# Altium footprint library 通讯接口.PcbLib: 19 footprints (part 1 of 2)
Each footprint in its own frame and in the unit in brackets; x right, y up, seen from the top. Pads: shape width x height; smd on the part's side, far side on the other; paste and mask are expansions set on the pad; w line width, h text height; cw(c..) or ccw(c..) is an arc to the next point about the centre after c.
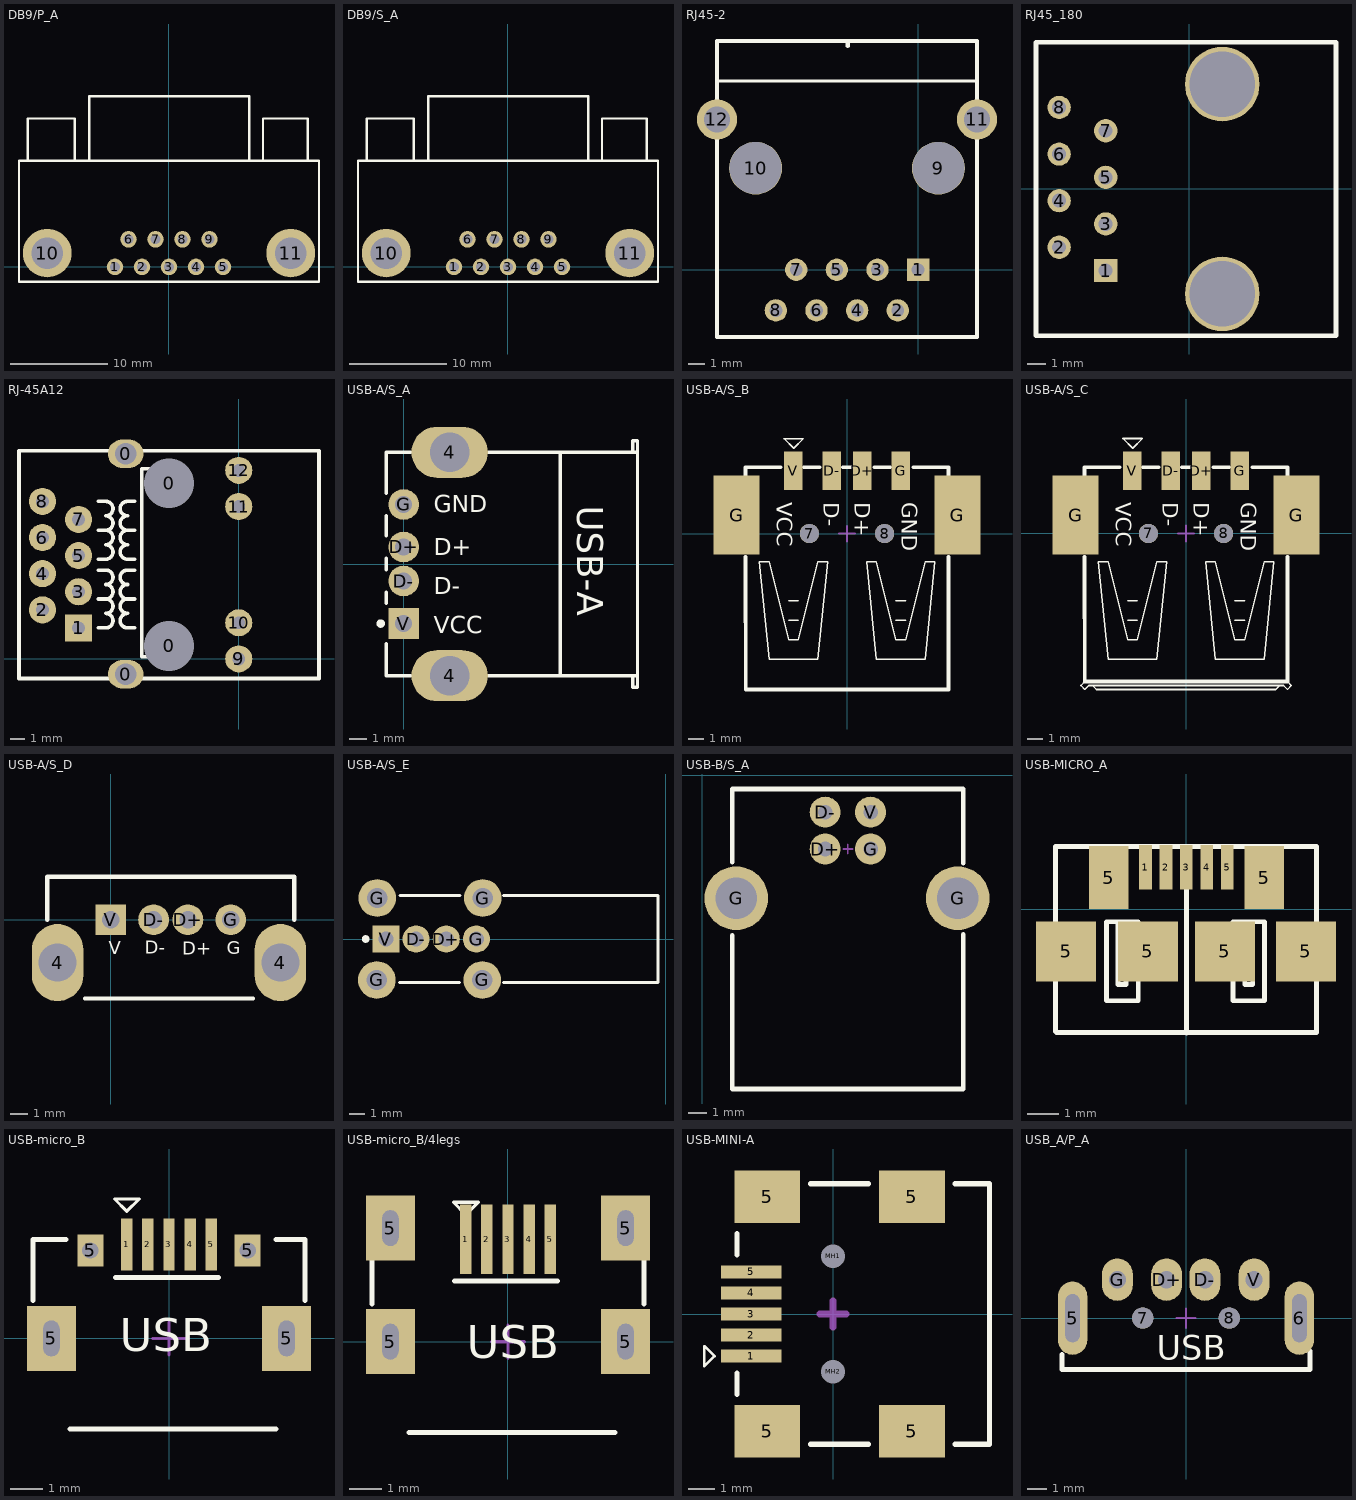
[diagram p0: the footprints below, top view; thin cyan lines are the x and y axes]

## DB9/P_A [mm] "9针公头串口,31*18.5*12.5mm"
pads (11):
  round 1.7 hole 1: 1(-5.546,0) 2(-2.773,0) 3(0,0) 4(2.773,0) 5(5.546,0) 6(-4.155,2.84) 7(-1.385,2.84) 8(1.385,2.84) 9(4.155,2.84)
  round 5 hole 3.25: 10(-12.5,1.42) 11(12.5,1.42)
Top Overlay:
  lines w0.254: -14.478,10.922 -14.478,15.24 -9.652,15.24 -9.652,10.922 ; -8.175,10.922 -8.175,17.526 8.225,17.526 8.225,10.922 ; 9.652,10.922 9.652,15.24 14.224,15.24 14.224,10.922 ; -15.4,-1.524 -15.4,10.922 15.4,10.922 15.4,-1.524 -15.4,-1.524
3D body "DB9 ĸ_A.STEP": height 12.65, standoff -3.16, extent -15.45,-1.253 15.45,17.247

## DB9/S_A [mm] "9针母头串口,31*18.5*12.5mm"
pads (11):
  round 1.7 hole 1: 1(-5.546,0) 2(-2.773,0) 3(0,0) 4(2.773,0) 5(5.546,0) 6(-4.155,2.84) 7(-1.385,2.84) 8(1.385,2.84) 9(4.155,2.84)
  round 5 hole 3.25: 10(-12.5,1.42) 11(12.5,1.42)
Top Overlay:
  lines w0.254: -14.478,10.922 -14.478,15.24 -9.652,15.24 -9.652,10.922 ; -8.175,10.922 -8.175,17.526 8.225,17.526 8.225,10.922 ; 9.652,10.922 9.652,15.24 14.224,15.24 14.224,10.922 ; -15.4,-1.524 15.4,-1.524 15.4,10.922 -15.4,10.922 -15.4,-1.524
3D body "DB9 公_A.STEP": height 12.65, standoff -3.16, extent -15.45,-1.253 15.45,17.247

## RJ45-2 [mil] "网线接口"
pads (12):
  rect 55x55 hole 31.5: 1(0,0)
  round 55 hole 31.5: 2(-50,-100) 3(-100,0) 4(-150,-100) 5(-200,0) 6(-250,-100) 7(-300,0) 8(-350,-100)
  round 130 hole 127.95 unplated: 9(50,250) 10(-400,250)
  round 98.42 hole 62.99: 11(145,370) 12(-495,370)
Top Overlay:
  lines w8: -488.19,464.57 141.73,464.57
  lines w10: -495,-165.35 144.65,-165.35 145,-165 145,370 145,562.99 -495,562.99 -495,370 -495,-165 ; -173.23,551.18 -173.23,559.06
3D body "Mod-Jack-K122449007-Stig-W.STEP": height 127.85, standoff -555.12, extent -490,-172.17 139.92,556.17

## RJ45_180 [mil] "网线接口"
height 53.15
pads (10):
  rect 50x50 hole 30: 1(-179.13,-175)
  round 50 hole 30: 2(-279.13,-125) 3(-179.13,-75) 4(-279.13,-25) 5(-179.13,25) 6(-279.13,75) 7(-179.13,125) 8(-279.13,175)
  round 160 hole 140: ""(70.87,-225) ""(70.87,225)
Top Overlay:
  lines w10: -328.74,-314.96 -328.74,314.96 314.96,314.96 314.96,-314.96 -328.74,-314.96
3D body "RJ-45, 8P8C, MOD JACK, TOP ENTRY, CAT 5E, RIA AJT26A8813.STEP": height 641.73, standoff -129.92, extent -313.88,-296.61 308.16,313.62

## RJ-45A12 [mil] "网线接口"
pads (16):
  oval 98.43x78.74 hole 59.06: 0(-312.99,-42.13) 0(-312.99,567.32)
  round 130 hole 137.8: 0(-192.91,35.83) 0(-192.91,485.83)
  rect 75x75 hole 35.43: 1(-442.91,85.83)
  round 75 hole 35.43: 2(-542.91,135.83) 3(-442.91,185.83) 4(-542.91,235.83) 5(-442.91,285.83) 6(-542.91,335.83) 7(-442.91,385.83) 8(-542.91,435.83) 9(0,0) 10(0,100) 11(0,421.65) 12(0,521.65)
Top Overlay:
  lines w10: -387.91,85.83 -367.91,85.83 ccw(c-367.91,105.83) -367.91,125.83 ccw(c-367.91,145.83) -367.91,165.83 ; -387.91,165.83 -367.91,165.83 ; -387.91,245.83 -367.91,245.83 cw(c-367.91,225.83) -367.91,205.83 cw(c-367.91,185.83) -367.91,165.83 ; -387.91,275.83 -367.91,275.83 ccw(c-367.91,295.83) -367.91,315.83 ccw(c-367.91,335.83) -367.91,355.83 ; -387.91,355.83 -367.91,355.83 ; -387.91,435.83 -367.91,435.83 cw(c-367.91,415.83) -367.91,395.83 cw(c-367.91,375.83) -367.91,355.83 ; -287.91,85.83 -307.91,85.83 cw(c-307.91,105.83) -307.91,125.83 cw(c-307.91,145.83) -307.91,165.83 ; -287.91,165.83 -307.91,165.83 ; -287.91,245.83 -307.91,245.83 ccw(c-307.91,225.83) -307.91,205.83 ccw(c-307.91,185.83) -307.91,165.83 ; -287.91,275.83 -307.91,275.83 cw(c-307.91,295.83) -307.91,315.83 cw(c-307.91,335.83) -307.91,355.83 ; -287.91,355.83 -307.91,355.83 ; -287.91,435.83 -307.91,435.83 ccw(c-307.91,415.83) -307.91,395.83 ccw(c-307.91,375.83) -307.91,355.83 ; -247.91,5.83 -267.91,5.83 -267.91,525.83 -247.91,525.83 ; -607.91,-54.17 222,-54.17 222,575.83 -607.91,575.83 -607.91,-54.17
Multi-Layer:
  text "J10" at -517.7,505.32 h25
3D body "HanRun-HR911105A.STEP": height 59.06, standoff -590.55, extent -605.26,-53 237.26,572.19

## USB-A/S_A [mm] "A型直插母头，"
height 7.01
pads (6):
  oval 4.5x3 hole 2.3: 4(2.71,-6.57) 4(2.71,6.57)
  round 1.8 hole 1: D+(0,1) D-(0,-1) G(0,3.5)
  rect 1.8x1.8 hole 1: V(0,-3.5)
Top Overlay:
  circle w0.25: c-1.35,-3.5 r0.125
  lines w0.2: -1.01,-4.7 -1.01,-6.565 0.41,-6.565 ; -1.01,-2.3 -1.01,-1.66 ; -1.01,-0.34 -1.01,0.34 ; -1.01,1.66 -1.01,2.84 ; -1.01,4.16 -1.01,6.565 0.41,6.565 ; 5.01,-6.565 13.752,-6.565 ; 5.01,6.565 13.752,6.565 ; 13.462,-6.565 13.462,-7.25 13.752,-7.25 13.752,7.25 13.462,7.25 13.462,6.565
  lines w0.203: 9.21,-6.565 9.21,6.565
  text "GND" at 1.778,3.048 h1.02
  text "D+" at 1.778,0.508 h1.02
  text "D-" at 1.778,-1.778 h1.02
  text "VCC" at 1.778,-4.064 h1.02
  text "USB-A" at 10.21,3.43 h1.52
3D body "USB A型 母-1.STEP": height 6.8, standoff -4.31, extent -0.605,-7.342 13.7,7.342

## USB-A/S_B [mm] "A型贴片母头，"
pads (8):
  round 1.25 hole 1.25 unplated: 7(-2.45,0) 8(2.45,0)
  rect 1.2x2.5 smd: D+(1,4.1) D-(-1,4.1) G(3.5,4.1) V(-3.5,4.1)
  rect 3x5.15 smd: G(-7.2,1.2) G(7.2,1.2)
Top Overlay:
  lines w0.1: -3.803,-5.649 -3.168,-5.649 ; -3.803,-4.379 -3.168,-4.379 ; 3.182,-5.649 3.817,-5.649 ; 3.182,-4.379 3.817,-4.379 ; -5.708,-1.839 -5.073,-1.839 -3.803,-6.919 -3.168,-6.919 -1.898,-1.839 -1.263,-1.839 -1.898,-8.189 -5.073,-8.189 -5.708,-1.839 ; -4.113,6.19 -2.843,6.19 -3.478,5.555 -4.113,6.19 ; 1.277,-1.839 1.912,-1.839 3.182,-6.919 3.817,-6.919 5.087,-1.839 5.722,-1.839 5.087,-8.189 1.912,-8.189 1.277,-1.839
  lines w0.254: -6.604,-1.524 -6.597,-10.16 6.611,-10.16 6.604,-1.524 ; -6.604,3.81 -6.604,4.318 -4.318,4.318 ; -2.794,4.318 -1.778,4.318 ; -0.254,4.318 0.254,4.318 ; 1.778,4.318 2.794,4.318 ; 4.318,4.318 6.611,4.318 6.604,3.81
  text "VCC" at -4.572,2.032 h1.02
  text "D-" at -1.524,2.032 h1.02
  text "D+" at 0.508,2.032 h1.02
  text "GND" at 3.556,2.032 h1.02
Mechanical 15:
  lines w0.127: -0.508,0 0.508,0 ; 0,-0.508 0,0.508
3D body "USB A型 贴片-母-1.STEP": height 6.9, standoff -0.55, extent -7.75,-9.9 7.75,4.8

## USB-A/S_C [mm] "A型贴片母头，"
pads (8):
  round 1.25 hole 1.25 unplated: 7(-2.45,0) 8(2.45,0)
  rect 1.2x2.5 smd: D+(1,4.1) D-(-1,4.1) G(3.5,4.1) V(-3.5,4.1)
  rect 3x5.15 smd: G(-7.2,1.2) G(7.2,1.2)
Top Overlay:
  lines w0.1: -6.597,-9.652 -6.851,-9.906 -6.597,-10.16 -6.343,-9.906 -6.089,-9.906 ; -3.803,-5.649 -3.168,-5.649 ; -3.803,-4.379 -3.168,-4.379 ; 3.182,-5.649 3.817,-5.649 ; 3.182,-4.379 3.817,-4.379 ; 6.611,-9.652 6.865,-9.906 6.611,-10.16 6.357,-9.906 6.103,-9.906 ; -6.089,-9.906 -5.835,-10.166 5.849,-10.166 6.103,-9.906 ; -6.089,-9.906 6.103,-9.906 ; -5.708,-1.839 -5.073,-8.189 -1.898,-8.189 -1.263,-1.839 -1.898,-1.839 -3.168,-6.919 -3.803,-6.919 -5.073,-1.839 -5.708,-1.839 ; -4.113,6.19 -3.478,5.555 -2.843,6.19 -4.113,6.19 ; 1.277,-1.839 1.912,-8.189 5.087,-8.189 5.722,-1.839 5.087,-1.839 3.817,-6.919 3.182,-6.919 1.912,-1.839 1.277,-1.839
  lines w0.254: -6.604,-1.524 -6.597,-9.652 ; -6.604,3.81 -6.604,4.318 -4.318,4.318 ; -6.597,-9.652 6.611,-9.652 ; -2.794,4.318 -1.778,4.318 ; -0.254,4.318 0.254,4.318 ; 1.778,4.318 2.794,4.318 ; 4.318,4.318 6.611,4.318 6.604,3.81 ; 6.604,-1.524 6.611,-9.652
  text "GND" at 3.556,2.032 h1.02
  text "D+" at 0.508,2.032 h1.02
  text "D-" at -1.524,2.032 h1.02
  text "VCC" at -4.572,2.032 h1.02
Mechanical 15:
  lines w0.127: -0.508,0 0.508,0 ; 0,-0.508 0,0.508
3D body "USB A型 贴片-母-2.STEP": height 7.4, standoff -0.55, extent -7.75,-9.9 7.75,4.8

## USB-A/S_D [mm] "A型直插母头，"
pads (6):
  oval 3x4.5 hole 2.2: 4(-3.1,-2.5) 4(9.9,-2.5)
  round 1.8 hole 1: D+(4.5,0) D-(2.5,0) G(7,0)
  rect 1.8x1.8 hole 1: V(0,0)
Top Overlay:
  lines w0.254: -3.7,0 -3.7,2.5 10.7,2.5 10.7,0 ; -1.5,-4.6 8.3,-4.6
  text "D-" at 1.996,-1.981 h0.76
  text "D+" at 4.181,-2.032 h0.76
  text "G" at 6.771,-2.007 h0.76
  text "V" at -0.112,-2.007 h0.76
Mechanical 1:
  lines w0.254: -0.2,-0.2 cw(c0,-0.2) 0,0
3D body "USB-H.stp": height 14, standoff -4, extent -3.705,-4.599 10.695,2.501

## USB-A/S_E [mm] "A型直插母头，"
pads (8):
  round 1.8 hole 1: D+(-14.56,0) D-(-16.56,0) G(-12.56,0)
  round 2.5 hole 1.35: G(-19.167,-2.718) G(-19.141,2.718) G(-12.167,-2.718) G(-12.141,2.718)
  rect 1.8x1.8 hole 1: V(-18.56,0)
Top Overlay:
  circle w0.25: c-19.91,0 r0.125
  lines w0.2: -17.65,-2.878 -13.684,-2.878 ; -17.624,2.878 -13.658,2.878 ; -10.773,-2.88 -0.508,-2.88 -0.508,2.88 -10.773,2.88
3D body "USB-4H4.stp": height 14.45, standoff -3.69, extent -19.725,-3.606 -0.475,3.644

## USB-B/S_A [mm] "b型USB 母座 16.3*13.7*11mm"
height 1.1
pads (6):
  round 1.7 hole 0.8: D+(6.751,-4.064) D-(6.751,-2.032) G(9.251,-4.064) V(9.251,-2.032)
  round 3.5 hole 2.3: G(1.86,-6.774) G(14.052,-6.774)
Top Overlay:
  lines w0.254: 1.651,-8.801 1.651,-17.272 14.351,-17.272 14.351,-8.75 ; 1.651,-4.788 1.651,-0.762 14.351,-0.762 14.351,-4.839
Mechanical 15:
  lines w0.1: 7.747,-4.064 8.255,-4.064 ; 8.001,-4.318 8.001,-3.81
3D body "USB B型 母-1.STEP": height 11.45, standoff -2.95, extent 1.141,-17.224 14.86,-0.924

## USB-MICRO_A [mm] "micro型USB ，5.9*8.2*2.5mm"
pads (11):
  rect 0.4x1.4 smd: 1(-1.283,1.333) 2(-0.635,1.333) 3(0.013,1.333) 4(0.66,1.333) 5(1.308,1.333)
  rect 1.9x1.9 smd: 5(-3.797,-1.333) 5(-1.206,-1.333) 5(1.232,-1.333) 5(3.797,-1.333)
  rect 1.25x2 smd: 5(-2.451,1.003) 5(2.476,1.003)
Top Overlay:
  lines w0.152: -4.127,-3.873 -4.127,1.994 ; -4.102,-3.899 4.102,-3.899 ; -4.077,1.994 4.102,1.994 ; -2.152,-0.394 -2.152,-2.379 -1.949,-2.379 -1.898,-2.379 -1.898,-0.394 ; 0.013,-3.91 0.013,1.968 ; 1.861,-0.394 1.861,-2.379 2.115,-2.379 2.115,-0.394 ; 4.127,-3.899 4.127,1.994 ; -2.513,-2.894 -2.513,-0.394 -1.513,-0.394 -1.513,-2.894 -2.513,-2.894 ; 1.487,-2.894 2.487,-2.894 2.487,-0.394 1.487,-0.394 1.487,-2.894
3D body "MICRO USB.STEP": height 2.77, standoff -0.17, extent -4.1,-3.912 4.1,2.018

## USB-micro_B [mm] "micro型USB ，5.7*7.8*2.5mm"
pads (9):
  rect 0.35x1.6 smd: 1(-1.3,2.9) 2(-0.65,2.9) 3(0,2.9) 4(0.65,2.9) 5(1.3,2.9)
  rect 1.5x2 hole 0.5 slot 1.1 at 90 deg: 5(-3.625,0) 5(3.625,0)
  rect 0.8x1 hole 0.5: 5(-2.425,2.71) 5(2.425,2.71)
Top Overlay:
  lines w0.1: -1.681,4.297 -1.3,3.916 -0.919,4.297 -1.681,4.297
  lines w0.152: -4.191,1.168 -4.191,3.048 -3.175,3.048 ; -3.048,-2.794 3.302,-2.794 ; -1.65,1.875 1.525,1.875 ; 3.302,3.048 4.191,3.048 4.191,1.168
  text "USB" at -1.524,-0.402 h1.02
Mechanical 15:
  lines w0.1: -0.508,0 0.508,0 ; 0,-0.508 0,0.508
3D body "USB micro_A.STEP": height 2.8, standoff -0.95, extent -4.001,-2.71 4.001,2.89

## USB-micro_B/4legs [mm] "micro型USB ，5.7*7.8*2.5mm"
pads (9):
  rect 0.35x2.15 smd: 1(-1.3,3.154) 2(-0.65,3.154) 3(0,3.154) 4(0.65,3.154) 5(1.3,3.154)
  rect 1.5x2 hole 0.5 slot 1.1 at 90 deg: 5(-3.625,0) 5(-3.625,3.5) 5(3.625,0) 5(3.625,3.5)
Top Overlay:
  lines w0.1: -1.681,4.297 -0.919,4.297 -1.3,3.916 -1.681,4.297
  lines w0.152: -4.191,1.168 -4.191,3.048 -3.175,3.048 ; -3.048,-2.794 3.302,-2.794 ; -1.65,1.875 1.525,1.875 ; 3.302,3.048 4.191,3.048 4.191,1.168
  text "USB" at -1.27,-0.508 h1.02
Mechanical 15:
  lines w0.1: -0.508,0 0.508,0 ; 0,-0.508 0,0.508
3D body "micre USB.stp": height 2.7, standoff -0.67, extent -4,-2.718 4,3.882

## USB-MINI-A [mm] "MINI型USB，7.9*7.5*4.1mm"
pads (11):
  rect 2.3x0.5 smd: 1(-3.108,-1.6) 2(-3.108,-0.8) 3(-3.108,0) 4(-3.108,0.8) 5(-3.108,1.6)
  rect 2.5x2 smd: 5(-2.5,-4.45) 5(-2.5,4.45) 5(3,-4.45) 5(3,4.45)
  round 0.6 hole 0.9 unplated: MH1(0,2.2) MH2(0,-2.2)
Top Overlay:
  lines w0.1: -4.886,-1.981 -4.505,-1.6 -4.886,-1.219 -4.886,-1.981
  lines w0.2: -3.65,-3.05 -3.65,-2.25 ; -3.65,2.25 -3.65,3.05 ; -0.85,-4.95 1.35,-4.95 ; -0.85,4.95 1.35,4.95 ; 4.65,-4.95 5.95,-4.95 5.95,4.95 4.65,4.95
Mechanical 15:
  lines w0.254: -0.508,0 0.508,0 ; 0,-0.508 0,0.508
3D body "USB MINI B型 贴片-母-1.STEP": height 3.95, standoff -0.7, extent -3.7,-4.75 6,4.75

## USB_A/P_A [mm] "A型USB 插头，20*13*4.5mm"
height 1.75
pads (8):
  oval 1.524x3.81 hole 0.762 slot 2.5 at 90 deg: 5(-5.9,0) 6(5.9,0)
  round 1.1 hole 1.1: 7(-2.25,0) 8(2.25,0)
  oval 1.6x2.2 hole 0.9: D+(-1.013,2) D-(0.987,2) G(-3.569,2) V(3.543,2)
Top Overlay:
  lines w0.254: -6.45,-1.9 -6.45,-2.667 6.45,-2.667 6.45,-1.7
  text "USB" at -1.524,-2.159 h1.27
Mechanical 15:
  lines w0.1: -0.508,0 0.508,0 ; 0,-0.508 0,0.508
3D body "USB A型 公-2.STEP": height 3.25, standoff -2.52, extent -6.473,-17.9 6.473,2.105